# Altium footprint library mastermind.PCBLIB: 1061 footprints (part 21 of 67)
Each footprint in its own frame and in the unit in brackets; x right, y up, seen from the top. Pads: shape width x height; smd on the part's side, far side on the other; paste and mask are expansions set on the pad; w line width, h text height; cw(c..) or ccw(c..) is an arc to the next point about the centre after c.
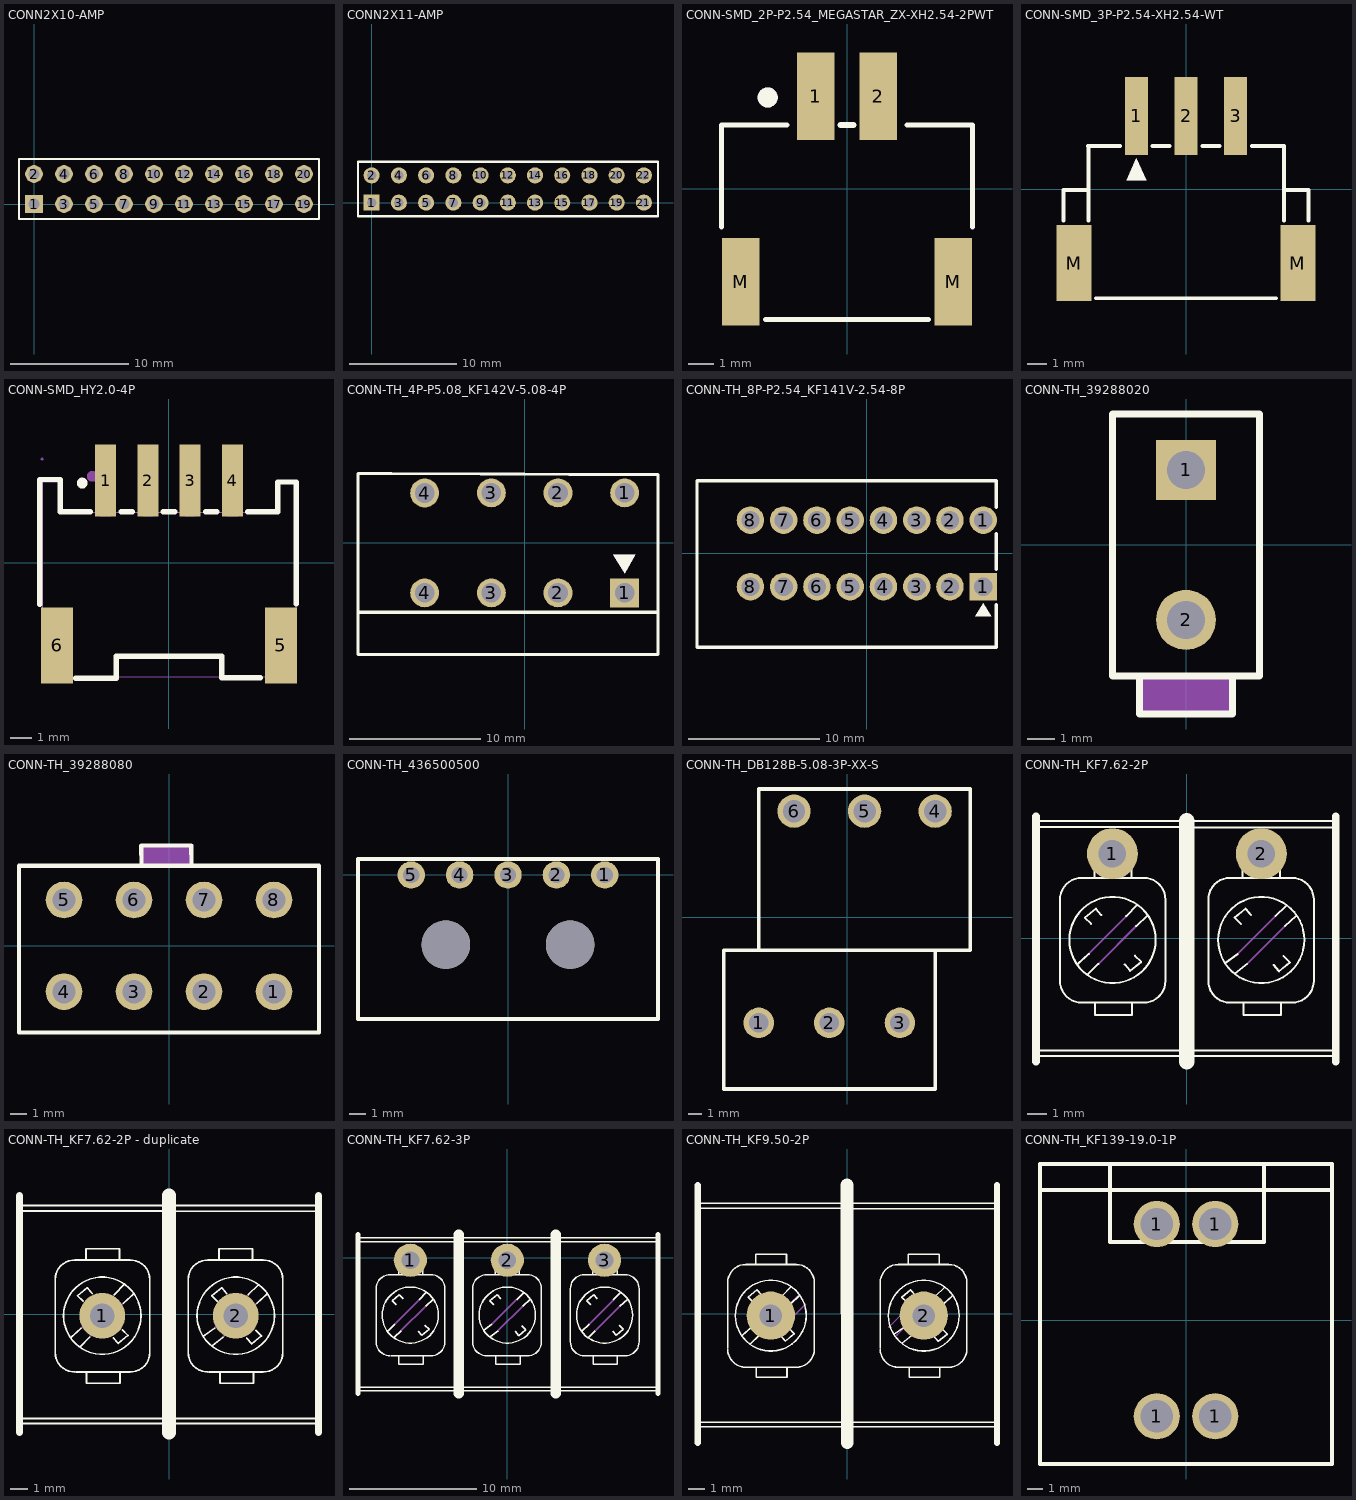
[diagram p20: the footprints below, top view; thin cyan lines are the x and y axes]

## CONN2X10-AMP [mm]
pads (20):
  rect 1.5x1.5 hole 0.9: 1(-0.011,0.007)
  round 1.5 hole 0.9: 2(-0.011,2.547) 3(2.529,0.007) 4(2.529,2.547) 5(5.069,0.007) 6(5.069,2.547) 7(7.609,0.007) 8(7.609,2.547) 9(10.149,0.007) 10(10.149,2.547) 11(12.689,0.007) 12(12.689,2.547) 13(15.229,0.007) 14(15.229,2.547) 15(17.769,0.007) 16(17.769,2.547) 17(20.309,0.007) 18(20.309,2.547) 19(22.849,0.007) 20(22.849,2.547)
Top Overlay:
  lines w0.2: -1.281,-1.263 24.119,-1.263 24.119,3.817 -1.281,3.817 -1.281,-1.263
3D body "1-825440-0.step": height 9.7, standoff -3, extent -1.3,-2.37 24.1,3.78

## CONN2X11-AMP [mm]
pads (22):
  rect 1.5x1.5 hole 0.9: 1(-0.011,0.007)
  round 1.5 hole 0.9: 2(-0.011,2.547) 3(2.529,0.007) 4(2.529,2.547) 5(5.069,0.007) 6(5.069,2.547) 7(7.609,0.007) 8(7.609,2.547) 9(10.149,0.007) 10(10.149,2.547) 11(12.689,0.007) 12(12.689,2.547) 13(15.229,0.007) 14(15.229,2.547) 15(17.769,0.007) 16(17.769,2.547) 17(20.309,0.007) 18(20.309,2.547) 19(22.849,0.007) 20(22.849,2.547) 21(25.389,0.007) 22(25.389,2.547)
Top Overlay:
  lines w0.2: -1.281,-1.263 26.7,-1.263 26.7,3.817 -1.281,3.817 -1.281,-1.263
3D body "1-825440-0.step": height 9.7, standoff -3, extent -1.3,-2.37 24.1,3.78

## CONN-SMD_2P-P2.54_MEGASTAR_ZX-XH2.54-2PWT [mm]
pads (4):
  rect 1.5x3.5 smd paste+0 mask+0.05: 1(-1.25,3.7) 2(1.25,3.7) M(-4.23,-3.7) M(4.23,-3.7)
Top Overlay:
  circle w0.4: c-3.16,3.65 r0.2
  lines w0.2: -5,-1.518 -5,2.55 -2.391,2.55 ; -3.249,-5.207 3.249,-5.207 ; 2.391,2.55 5,2.55 5,-1.518
  lines w0.254: -0.25,2.55 0.25,2.55
Mechanical 15:
  circle w0.4: c-3.16,3.65 r0.2
3D body "xh_2_54_fixed_terminal_asm.stp": height 6.15, standoff 0.15, extent -4.9,-4.6 5.1,5.1

## CONN-SMD_3P-P2.54-XH2.54-WT [mm]
pads (5):
  rect 1.2x4 smd paste+0 mask+0.05: 1(-2.54,3.775) 2(0,3.775) 3(2.54,3.775)
  rect 1.8x3.9 smd paste+0 mask+0.05: M(-5.74,-3.775) M(5.74,-3.775)
Top Overlay:
  region: -3.048,0.464 -2.159,0.464 -2.032,0.464 -2.54,1.607
  lines w0.2: -6.27,-1.594 -6.27,-0.025 -4.995,-0.025 -4.995,-1.594 ; -5.02,2.225 -3.371,2.225 ; -5.019,2.226 -4.996,2.226 -4.996,-0.025 ; -4.617,-5.575 2.077,-5.575 4.609,-5.575 ; -1.709,2.225 -0.831,2.225 ; 0.831,2.225 1.709,2.225 ; 3.371,2.225 5.02,2.225 5.02,-0.025 ; 5.02,-1.594 5.02,-0.025 ; 6.27,-1.594 6.27,-0.025 5.02,-0.025
Mechanical 15:
  region: -3.048,0.464 -2.159,0.464 -2.032,0.464 -2.54,1.607
3D body "XH2.54 3p.stp": height 6, standoff 0, extent -5.975,-5.7 5.975,4.9

## CONN-SMD_HY2.0-4P [mm]
pads (6):
  rect 1x3.4 smd paste+0 mask+0.051: 1(-3,3.9) 2(-1,3.9) 3(1,3.9) 4(3,3.9)
  rect 1.5x3.6 smd paste+0 mask+0.051: 5(5.3,-3.9) 6(-5.3,-3.9)
Top Overlay:
  circle w0.254: c-4.11,3.78 r0.127
  lines w0.254: -6.11,-1.95 -6.11,3.95 ; -6.11,3.949 -5.14,3.949 -5.14,2.43 -3.731,2.43 ; -4.41,-5.45 -2.5,-5.45 -2.5,-4.41 2.49,-4.41 2.49,-5.43 4.319,-5.43 ; -2.269,2.43 -1.731,2.43 ; -0.269,2.43 0.269,2.43 ; 1.731,2.43 2.269,2.43 ; 3.731,2.43 5.15,2.43 5.15,3.83 6.03,3.83 6.03,-1.93
Mechanical 6:
  circle w0.254: c-3.63,4.1 r0.127
Mechanical 15:
  region: -5.94,4.91 -5.94,4.934 -5.975,4.969 -6.024,4.969 -6.059,4.934 -6.06,4.91 -6.059,4.885 -6.024,4.851 -5.975,4.851 -5.94,4.885
  region: 3.25,2.2 2.75,2.2 2.75,4.91 3.25,4.91
  region: -5.1,-5.19 -5.5,-5.19 -5.5,-2.59 -5.1,-2.59
  region: 5.5,-5.19 5.1,-5.19 5.1,-2.59 5.5,-2.59
  region: 1.25,2.2 0.75,2.2 0.75,4.91 1.25,4.91
  region: -0.75,2.2 -1.25,2.2 -1.25,4.91 -0.75,4.91
  region: -2.75,2.2 -3.25,2.2 -3.25,4.91 -2.75,4.91
  lines w0.051: -6,-5.375 6,-5.375 6,3.85 5.2,3.85 5.2,2.41 -5.2,2.4 -5.2,3.85 -6,3.85 -6,-5.375

## CONN-TH_4P-P5.08_KF142V-5.08-4P [mm]
pads (8):
  rect 2.2x2.2 hole 1.5: 1(7.62,-3.81)
  round 2.2 hole 1.5: 1(7.62,3.81) 2(2.54,-3.81) 2(2.54,3.81) 3(-2.54,-3.81) 3(-2.54,3.81) 4(-7.62,3.796) 4(-7.62,-3.81)
Top Overlay:
  region: 7.64,-2.3 8.44,-0.9 6.74,-0.9
  lines w0.254: -12.7,-5.3 -10.16,-5.3 10.16,-5.3 ; -12.7,-8.51 -12.7,5.284 -10.16,5.284 10.16,5.19 10.16,-8.51 -12.7,-8.51
Mechanical 15:
  region: 7.64,-2.3 8.44,-0.9 6.74,-0.9

## CONN-TH_8P-P2.54_KF141V-2.54-8P [mm]
pads (16):
  rect 2.1x2.1 hole 1.4: 1(8.89,-2.54)
  round 2.1 hole 1.4: 1(8.89,2.54) 2(6.35,-2.54) 2(6.35,2.54) 3(3.81,-2.54) 3(3.81,2.54) 4(1.27,-2.54) 4(1.27,2.54) 5(-1.27,-2.54) 5(-1.27,2.54) 6(-3.81,-2.54) 6(-3.81,2.54) 7(-6.35,-2.54) 7(-6.35,2.54) 8(-8.89,-2.54) 8(-8.89,2.54)
Top Overlay:
  region: 8.89,-3.81 8.29,-4.81 9.49,-4.81
  lines w0.254: 9.89,-3.9 9.89,-7.16 -12.97,-7.16 -12.97,5.54 9.89,5.54 9.89,3.5 ; 9.89,-1.2 9.89,1.5

## CONN-TH_39288020 [mm]
pads (2):
  rect 2.2x2.2 hole 1.4 paste-2539.97 mask+0.051: 1(0,2.75)
  round 2.2 hole 1.4 paste-2539.97 mask+0.051: 2(0,-2.75)
Top Overlay:
  lines w0.254: -1.7,-4.8 -1.7,-6.2 1.7,-6.2 1.7,-4.8 ; -2.7,-4.8 -2.7,4.8 2.7,4.8 2.7,-4.8 -2.7,-4.8
Mechanical 15:
  region: -1.651,-4.826 -1.651,-6.096 1.651,-6.096 1.651,-4.826
3D body "0039288020.stp": height 12.8, standoff -3.5, extent -3.1,-6.2 3.1,4.8

## CONN-TH_39288080 [mm]
pads (8):
  round 2.2 hole 1.4 paste-2539.97 mask+0.051: 1(6.3,-2.75) 2(2.1,-2.75) 3(-2.1,-2.75) 4(-6.3,-2.75) 5(-6.3,2.75) 6(-2.1,2.75) 7(2.1,2.75) 8(6.3,2.75)
Top Overlay:
  lines w0.254: -1.652,4.801 -1.659,6.002 1.336,6.015 1.348,4.9 ; -9,-5.2 9,-5.2 9,4.8 -9,4.8 -9,-5.2
Mechanical 15:
  region: -1.606,6.004 1.366,6.004 1.366,4.746 -1.593,4.746 -1.593,5.242
3D body "0039288080.stp": height 12.8, standoff -3.5, extent -9.36,-5.2 9.44,5.8

## CONN-TH_436500500 [mm]
pads (7):
  round 1.7 hole 1: 1(6,0) 2(3,0) 3(0,0) 4(-3,0) 5(-6,0)
  round 3 hole 3 unplated: ""(-3.85,-4.32) ""(3.85,-4.32)
Top Overlay:
  lines w0.254: -9.3,-8.92 -9.3,0.98 9.3,0.98 9.3,-8.92 -9.3,-8.92

## CONN-TH_DB128B-5.08-3P-XX-S [mm]
pads (6):
  round 2.2 hole 1.4: 1(-6.35,-7.62) 2(-1.27,-7.62) 3(3.81,-7.62)
  round 2.4 hole 1.6: 4(6.35,7.62) 5(1.27,7.62) 6(-3.81,7.62)
Top Overlay:
  lines w0.254: -6.35,-2.38 6.35,-2.38 ; -6.35,-2.38 -8.89,-2.38 -8.89,-12.38 6.35,-12.38 6.35,-2.38 ; -6.35,-2.38 -6.35,9.22 8.89,9.22 8.89,-2.38 6.35,-2.38

## CONN-TH_KF7.62-2P [mm]
pads (2):
  round 2.6 hole 1.4: 1(-3.8,4.3) 2(3.8,4.3)
Top Overlay:
  circle w0.102: c3.797,-0.099 r2.2
  circle w0.102: c-3.797,-0.099 r2.2
  lines w0.102: -7.7,-5.744 0.051,-5.744 7.6,-5.744 ; -7.7,5.667 -0.076,5.667 ; -7.7,5.972 -0.009,5.972 ; -7.629,-6.023 -0.102,-6.023 ; -6.477,-2.184 ccw(c-5.359,-2.184) -5.359,-3.302 ; -6.477,-2.134 -6.477,1.956 cw(c-5.359,1.956) -5.359,3.073 -2.21,3.073 cw(c-2.21,1.956) -1.092,1.956 -1.092,-2.184 cw(c-2.21,-2.184) -2.21,-3.302 -5.309,-3.302 ; -5.585,-1.349 -5.004,-0.813 ; -5.055,-1.854 -4.521,-1.321 ; -4.889,0.724 -5.207,1.041 -4.65,1.497 -4.367,1.166 ; -4.724,3.073 -4.724,3.708 -4.216,3.708 -2.819,3.708 -2.819,3.073 ; -4.699,-3.302 -4.699,-3.937 -4.191,-3.937 -2.794,-3.937 -2.794,-3.302 ; -3.175,-1.346 -2.892,-1.677 -2.335,-1.221 -2.653,-0.904 ; -3.099,1.118 -2.539,1.7 ; -2.591,0.61 -1.996,1.159 ; -0.025,5.642 7.6,5.642 ; 0.076,5.972 7.611,5.972 ; 0.102,-6.023 7.611,-6.023 ; 1.092,-2.184 ccw(c2.21,-2.184) 2.21,-3.302 ; 1.092,-2.134 1.092,1.956 cw(c2.21,1.956) 2.21,3.073 5.359,3.073 cw(c5.359,1.956) 6.477,1.956 6.477,-2.184 cw(c5.359,-2.184) 5.359,-3.302 2.261,-3.302 ; 1.956,-1.27 2.591,-0.813 ; 2.464,-1.803 3.073,-1.321 ; 2.754,0.726 2.437,1.043 2.993,1.499 3.277,1.168 ; 2.845,3.073 2.845,3.708 4.242,3.708 4.75,3.708 4.75,3.073 ; 2.896,-3.302 2.896,-3.937 4.293,-3.937 4.801,-3.937 4.801,-3.302 ; 4.42,-1.372 4.703,-1.702 5.26,-1.247 4.942,-0.929 ; 4.521,1.118 5.08,1.651 ; 5.004,0.61 5.588,1.143
  lines w0.4: -7.7,-6.3 -7.7,6.2 ; 7.6,-6.3 7.6,6.2
  lines w0.8: -0.009,-6.3 -0.009,5.972
Mechanical 8:
  lines w0.102: -5.003,-0.809 -3.087,1.107 ; -4.508,-1.305 -2.597,0.607 ; 2.591,-0.809 4.508,1.107 ; 3.087,-1.305 4.997,0.607
3D body "KF7_62-2P.STEP": height 12.4, standoff -6.3, extent -7.629,-6.044 7.611,5.956

## CONN-TH_KF7.62-2P - duplicate [mm]
pads (2):
  round 2.6 / inner round 1.524 / far side round 1.7 hole 1.4: 1(-3.8,-0.1) 2(3.8,-0.1)
Top Overlay:
  circle w0.102: c-3.797,-0.099 r2.2
  circle w0.102: c3.797,-0.099 r2.2
  lines w0.102: -8.534,-6.223 -0.102,-6.223 ; -8.509,5.867 -0.076,5.867 ; -8.407,6.172 0.025,6.172 ; -8.382,-5.944 0.051,-5.944 8.484,-5.944 ; -6.477,-2.184 ccw(c-5.359,-2.184) -5.359,-3.302 ; -6.477,-2.134 -6.477,1.956 cw(c-5.359,1.956) -5.359,3.073 -2.21,3.073 cw(c-2.21,1.956) -1.092,1.956 -1.092,-2.184 cw(c-2.21,-2.184) -2.21,-3.302 -5.309,-3.302 ; -5.585,-1.349 -5.004,-0.813 ; -5.055,-1.854 -4.521,-1.321 ; -4.889,0.724 -5.207,1.041 -4.65,1.497 -4.367,1.166 ; -4.724,3.073 -4.724,3.708 -4.216,3.708 -2.819,3.708 -2.819,3.073 ; -4.699,-3.302 -4.699,-3.937 -4.191,-3.937 -2.794,-3.937 -2.794,-3.302 ; -3.175,-1.346 -2.892,-1.677 -2.335,-1.221 -2.653,-0.904 ; -3.099,1.118 -2.539,1.7 ; -2.591,0.61 -1.996,1.159 ; -0.025,5.842 8.407,5.842 ; 0.076,6.172 8.509,6.172 ; 0.102,-6.223 8.534,-6.223 ; 1.092,-2.184 ccw(c2.21,-2.184) 2.21,-3.302 ; 1.092,-2.134 1.092,1.956 cw(c2.21,1.956) 2.21,3.073 5.359,3.073 cw(c5.359,1.956) 6.477,1.956 6.477,-2.184 cw(c5.359,-2.184) 5.359,-3.302 2.261,-3.302 ; 1.956,-1.27 2.591,-0.813 ; 2.464,-1.803 3.073,-1.321 ; 2.754,0.726 2.437,1.043 2.993,1.499 3.277,1.168 ; 2.845,3.073 2.845,3.708 4.242,3.708 4.75,3.708 4.75,3.073 ; 2.896,-3.302 2.896,-3.937 4.293,-3.937 4.801,-3.937 4.801,-3.302 ; 4.42,-1.372 4.703,-1.702 5.26,-1.247 4.942,-0.929 ; 4.521,1.118 5.08,1.651 ; 5.004,0.61 5.588,1.143
  lines w0.4: -8.5,-6.75 -8.5,6.75 ; 8.5,-6.75 8.5,6.75
  lines w0.8: -0.009,-6.75 -0.009,6.75
Mechanical 8:
  lines w0.102: -5.003,-0.809 -3.087,1.107 ; -4.508,-1.305 -2.597,0.607 ; 2.591,-0.809 4.508,1.107 ; 3.087,-1.305 4.997,0.607
3D body "Barrier Termianl.STEP": height 14.8, standoff -2.5, extent -8.38,-6.877 8.38,6.833

## CONN-TH_KF7.62-3P [mm]
pads (3):
  round 2.6 hole 1.4: 1(-7.6,-0.2) 2(0,-0.2) 3(7.62,-0.2)
Top Overlay:
  circle w0.102: c-0.003,-4.498 r2.2
  circle w0.102: c-7.597,-4.498 r2.2
  circle w0.102: c7.623,-4.498 r2.2
  lines w0.102: -11.7,-10.423 -3.902,-10.423 ; -11.7,-10.144 -3.749,-10.144 11.758,-10.144 ; -11.7,1.572 -3.775,1.572 ; -11.507,1.267 -3.876,1.267 ; -10.277,-6.584 ccw(c-9.159,-6.584) -9.159,-7.702 ; -10.277,-6.534 -10.277,-2.444 cw(c-9.159,-2.444) -9.159,-1.327 -6.01,-1.327 cw(c-6.01,-2.444) -4.892,-2.444 -4.892,-6.584 cw(c-6.01,-6.584) -6.01,-7.702 -9.109,-7.702 ; -9.385,-5.749 -8.804,-5.213 ; -8.855,-6.254 -8.321,-5.721 ; -8.69,-3.676 -9.007,-3.359 -8.45,-2.903 -8.167,-3.234 ; -8.524,-1.327 -8.524,-0.692 -8.016,-0.692 -6.619,-0.692 -6.619,-1.327 ; -8.499,-7.702 -8.499,-8.337 -7.991,-8.337 -6.594,-8.337 -6.594,-7.702 ; -6.975,-5.746 -6.692,-6.077 -6.135,-5.621 -6.453,-5.304 ; -6.899,-3.282 -6.339,-2.7 ; -6.391,-3.79 -5.796,-3.241 ; -3.825,1.242 11.758,1.242 ; -3.724,1.572 11.758,1.572 ; -3.698,-10.423 11.809,-10.423 ; -2.708,-6.584 ccw(c-1.59,-6.584) -1.59,-7.702 ; -2.708,-6.534 -2.708,-2.444 cw(c-1.59,-2.444) -1.59,-1.327 1.559,-1.327 cw(c1.559,-2.444) 2.677,-2.444 2.677,-6.584 cw(c1.559,-6.584) 1.559,-7.702 -1.539,-7.702 ; -1.844,-5.67 -1.209,-5.213 ; -1.336,-6.203 -0.727,-5.721 ; -1.046,-3.674 -1.363,-3.356 -0.807,-2.901 -0.523,-3.232 ; -0.955,-1.327 -0.955,-0.692 0.442,-0.692 0.95,-0.692 0.95,-1.327 ; -0.904,-7.702 -0.904,-8.337 0.493,-8.337 1.001,-8.337 1.001,-7.702 ; 0.62,-5.772 0.903,-6.102 1.46,-5.647 1.142,-5.329 ; 0.721,-3.282 1.28,-2.749 ; 1.204,-3.79 1.788,-3.257 ; 4.943,-6.584 ccw(c6.061,-6.584) 6.061,-7.702 ; 4.943,-6.534 4.943,-2.444 cw(c6.061,-2.444) 6.061,-1.327 9.21,-1.327 cw(c9.21,-2.444) 10.328,-2.444 10.328,-6.584 cw(c9.21,-6.584) 9.21,-7.702 6.111,-7.702 ; 5.835,-5.749 6.416,-5.213 ; 6.365,-6.254 6.899,-5.721 ; 6.531,-3.676 6.213,-3.359 6.77,-2.903 7.053,-3.234 ; 6.696,-1.327 6.696,-0.692 7.204,-0.692 8.601,-0.692 8.601,-1.327 ; 6.721,-7.702 6.721,-8.337 7.229,-8.337 8.626,-8.337 8.626,-7.702 ; 8.245,-5.746 8.528,-6.077 9.085,-5.621 8.767,-5.304 ; 8.321,-3.282 8.881,-2.7 ; 8.829,-3.79 9.424,-3.241
  lines w0.4: -11.7,-10.626 -11.7,1.8 ; 11.809,-10.626 11.809,1.8
  lines w0.8: -3.809,-10.626 -3.809,1.8 ; 3.8,-10.626 3.8,1.8
Mechanical 8:
  lines w0.102: -8.803,-5.209 -6.887,-3.292 ; -8.308,-5.704 -6.397,-3.793 ; -1.209,-5.209 0.708,-3.292 ; -0.713,-5.704 1.197,-3.793 ; 6.417,-5.209 8.333,-3.292 ; 6.912,-5.704 8.823,-3.793
3D body "KF7_62-3P.STEP": height 12.4, standoff -6.3, extent -11.507,-10.444 11.758,1.556

## CONN-TH_KF9.50-2P [mm]
pads (2):
  round 3 hole 1.4: 1(-4.75,-0.1) 2(4.75,-0.1)
Top Overlay:
  circle w0.102: c-4.75,-0.1 r2.2
  circle w0.102: c4.75,-0.1 r2.2
  lines w0.102: -9.335,-6.998 -0.102,-6.998 ; -9.296,6.566 -0.076,6.566 ; -9.246,-6.718 0.051,-6.718 9.271,-6.718 ; -9.195,6.871 0.025,6.871 ; -7.43,-2.186 ccw(c-6.312,-2.186) -6.312,-3.304 ; -7.43,-2.135 -7.43,1.954 cw(c-6.312,1.954) -6.312,3.072 -3.162,3.072 cw(c-3.162,1.954) -2.045,1.954 -2.045,-2.186 cw(c-3.162,-2.186) -3.162,-3.304 -6.261,-3.304 ; -6.538,-1.351 -5.956,-0.814 ; -6.007,-1.856 -5.474,-1.322 ; -5.842,0.722 -6.16,1.04 -5.603,1.495 -5.32,1.165 ; -5.677,3.072 -5.677,3.707 -5.169,3.707 -3.772,3.707 -3.772,3.072 ; -5.652,-3.304 -5.652,-3.939 -5.144,-3.939 -3.747,-3.939 -3.747,-3.304 ; -4.128,-1.348 -3.844,-1.678 -3.288,-1.223 -3.605,-0.905 ; -4.051,1.116 -3.492,1.699 ; -3.543,0.608 -2.948,1.157 ; -0.025,6.54 9.233,6.54 ; 0.076,6.871 9.195,6.871 ; 0.102,-6.998 9.233,-6.998 ; 2.045,-2.186 ccw(c3.162,-2.186) 3.162,-3.304 ; 2.045,-2.135 2.045,1.954 cw(c3.162,1.954) 3.162,3.072 6.312,3.072 cw(c6.312,1.954) 7.43,1.954 7.43,-2.186 cw(c6.312,-2.186) 6.312,-3.304 3.213,-3.304 ; 2.908,-1.272 3.543,-0.814 ; 3.416,-1.805 4.026,-1.322 ; 3.707,0.724 3.389,1.042 3.946,1.497 4.229,1.167 ; 3.797,3.072 3.797,3.707 5.194,3.707 5.702,3.707 5.702,3.072 ; 3.848,-3.304 3.848,-3.939 5.245,-3.939 5.753,-3.939 5.753,-3.304 ; 5.372,-1.373 5.655,-1.704 6.212,-1.248 5.895,-0.931 ; 5.474,1.116 6.033,1.649 ; 5.956,0.608 6.541,1.141
  lines w0.4: -9.3,-8.007 -9.3,7.993 ; 9.3,-8.007 9.3,7.993
  lines w0.8: -0.009,8.005 0,-7.995
Mechanical 8:
  lines w0.102: -5.003,-0.809 -3.087,1.107 ; -4.508,-1.305 -2.597,0.607 ; 2.591,-0.809 4.508,1.107 ; 3.087,-1.305 4.997,0.607
3D body "Barrier TermianlBigger.STEP": height 18.2, standoff -2.5, extent -10.154,-7.994 10.216,8.006

## CONN-TH_KF139-19.0-1P [mm]
pads (4):
  round 3 hole 2.1: 1(-1.9,-6.25) 1(-1.9,6.25) 1(1.9,-6.25) 1(1.9,6.25)
Top Overlay:
  lines w0.254: -9.5,8.46 9.5,8.46 ; -9.5,-9.35 9.5,-9.35 9.5,10.15 -9.5,10.15 -9.5,-9.35 ; -4.953,5.07 -4.953,10.15 5.08,10.15 5.08,5.07 -4.953,5.07